# Altium footprint library Arduino.PcbLib: 12 footprints
Each footprint in its own frame and in the unit in brackets; x right, y up, seen from the top. Pads: shape width x height; smd on the part's side, far side on the other; paste and mask are expansions set on the pad; w line width, h text height; cw(c..) or ccw(c..) is an arc to the next point about the centre after c.
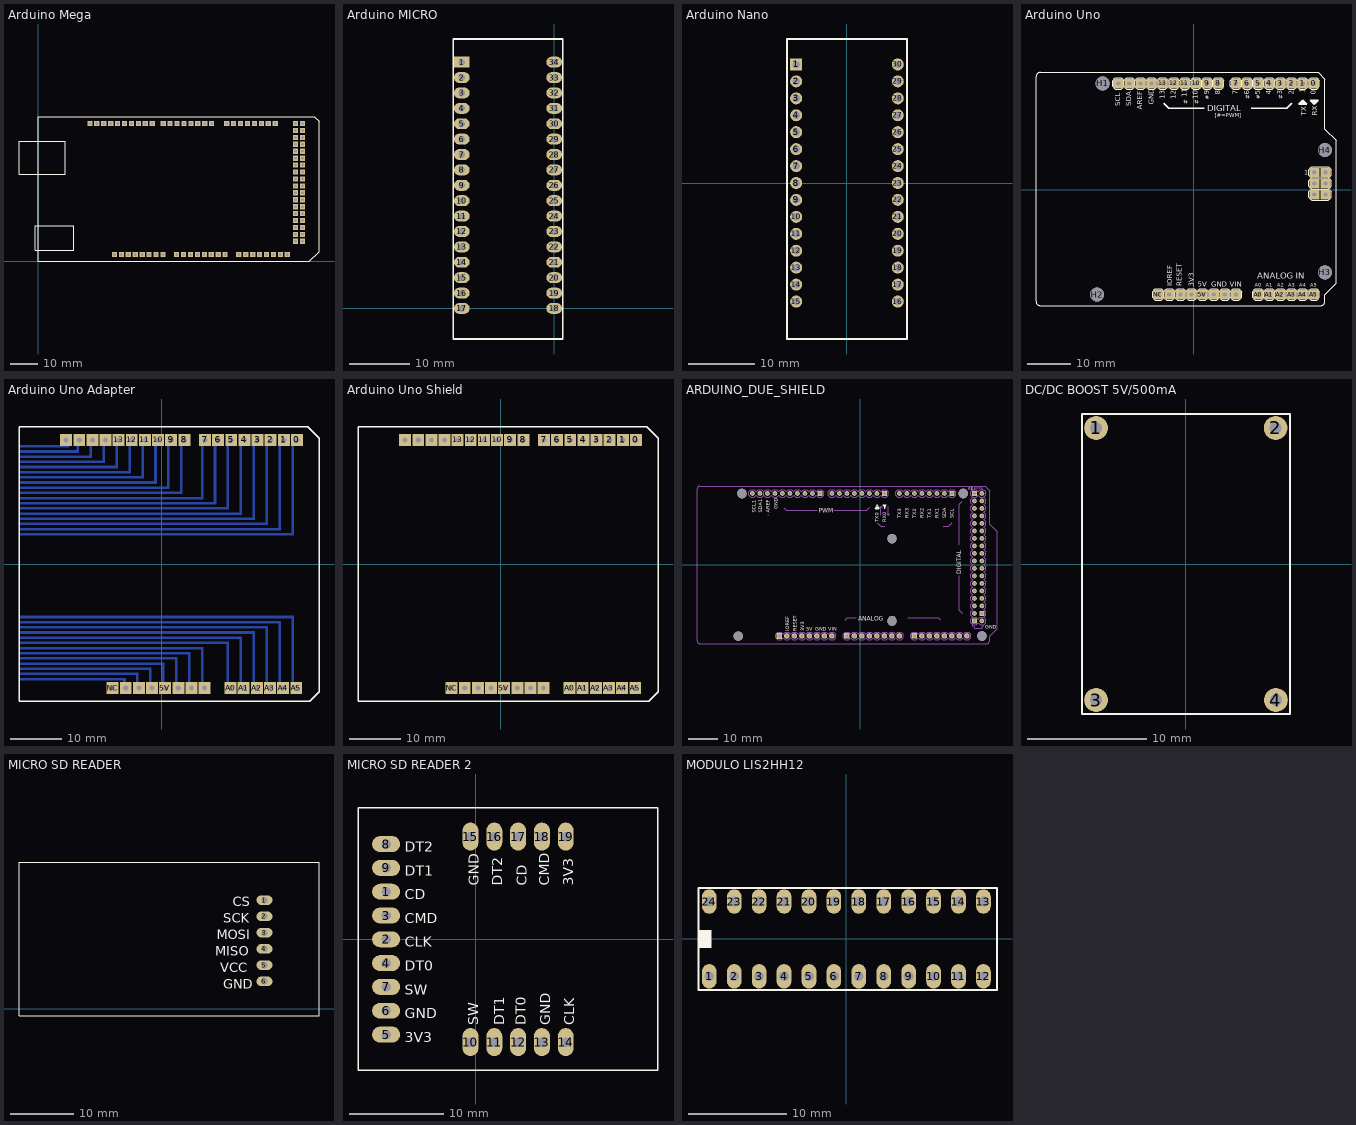
[diagram p0: the footprints below, top view; thin cyan lines are the x and y axes]

## Arduino Due [mm]

## Arduino Mega [mm]
pads (86):
  rect 1.9x1.9 hole 1: 0(63.64,50.5) 1(61.1,50.5) 2(58.56,50.5) 3(56.02,50.5) 3V3(35.62,2.5) 4(53.48,50.5) 5(50.94,50.5) 5V(38.16,2.5) 5V_2(94.4,50.5) 5V_3(96.94,50.5) 6(48.4,50.5) 7(45.86,50.5) 8(41.86,50.5) 9(39.32,50.5) 10(36.78,50.5) 11(34.24,50.5) 12(31.7,50.5) 13(29.16,50.5) 14(69.16,50.5) 15(71.7,50.5) 16(74.24,50.5) 17(76.78,50.5) 18(79.32,50.5) 19(81.86,50.5) 20(84.4,50.5) 21(86.94,50.5) 22(94.4,47.96) 23(96.94,47.96) 24(94.4,45.42) 25(96.94,45.42) 26(94.4,42.88) 27(96.94,42.88) 28(94.4,40.34) 29(96.94,40.34) 30(94.4,37.8) 31(96.94,37.8) 32(94.4,35.26) 33(96.94,35.26) 34(94.4,32.72) 35(96.94,32.72) 36(94.4,30.18) 37(96.94,30.18) 38(94.4,27.64) 39(96.94,27.64) 40(94.4,25.1) 41(96.94,25.1) 42(94.4,22.56) 43(96.94,22.56) 44(94.4,20.02) 45(96.94,20.02) 46(94.4,17.48) 47(96.94,17.48) 48(94.4,14.94) 49(96.94,14.94) 50(94.4,12.4) 51(96.94,12.4) 52(94.4,9.86) 53(96.94,9.86) A0(50.8,2.5) A1(53.34,2.5) A2(55.88,2.5) A3(58.42,2.5) A4(60.96,2.5) A5(63.5,2.5) A6(66.04,2.5) A7(68.58,2.5) A8(73.6,2.5) A9(76.14,2.5) A10(78.68,2.5) A11(81.22,2.5) A12(83.76,2.5) A13(86.3,2.5) A14(88.84,2.5) A15(91.38,2.5) AREF(24.08,50.5) GND1(40.7,2.5) GND2(43.24,2.5) GND3(26.62,50.5) GND4(94.4,7.32) GND5(96.94,7.32) IOREF(30.54,2.5) NC(28,2.5) RESET(33.08,2.5) SCL(19,50.5) SDA(21.54,50.5) Vin(45.78,2.5)
Top Overlay:
  lines w0.254: -7,32 10,32 10,44 -7,44 -7,32 ; -1,4 -1,13 13,13 13,4 -1,4 ; 0,0 0,53 101.3,53 103,51.3 103,3.5 99.5,0 0,0

## Arduino MICRO [mm]
pads (34):
  rect 2.6x1.8 hole 1.1: 1(-15.24,40.64)
  oval 2.6x1.8 hole 1.1: 2(-15.24,38.1) 3(-15.24,35.56) 4(-15.24,33.02) 5(-15.24,30.48) 6(-15.24,27.94) 7(-15.24,25.4) 8(-15.24,22.86) 9(-15.24,20.32) 10(-15.24,17.78) 11(-15.24,15.24) 12(-15.24,12.7) 13(-15.24,10.16) 14(-15.24,7.62) 15(-15.24,5.08) 16(-15.24,2.54) 17(-15.24,0) 18(0,0) 19(0,2.54) 20(0,5.08) 21(0,7.62) 22(0,10.16) 23(0,12.7) 24(0,15.24) 25(0,17.78) 26(0,20.32) 27(0,22.86) 28(0,25.4) 29(0,27.94) 30(0,30.48) 31(0,33.02) 32(0,35.56) 33(0,38.1) 34(0,40.64)
Top Overlay:
  lines w0.254: -16.62,-5.04 1.38,-5.04 1.38,44.46 -16.62,44.46 -16.62,-5.04
3D body "ARDUINO MICRO.STEP": height 12.61, standoff -5.99, extent -16.62,-4.99 1.38,44.42

## Arduino Nano [mm]
pads (30):
  rect 1.8x1.8 hole 1.1: 1(-7.62,17.78)
  round 1.8 hole 1.1: 2(-7.62,15.24) 3(-7.62,12.7) 4(-7.62,10.16) 5(-7.62,7.62) 6(-7.62,5.08) 7(-7.62,2.54) 8(-7.62,0) 9(-7.62,-2.54) 10(-7.62,-5.08) 11(-7.62,-7.62) 12(-7.62,-10.16) 13(-7.62,-12.7) 14(-7.62,-15.24) 15(-7.62,-17.78) 16(7.62,-17.78) 17(7.62,-15.24) 18(7.62,-12.7) 19(7.62,-10.16) 20(7.62,-7.62) 21(7.62,-5.08) 22(7.62,-2.54) 23(7.62,0) 24(7.62,2.54) 25(7.62,5.08) 26(7.62,7.62) 27(7.62,10.16) 28(7.62,12.7) 29(7.62,15.24) 30(7.62,17.78)
Top Overlay:
  lines w0.254: -9,-23.4 9,-23.4 9,21.6 -9,21.6 -9,-23.4
3D body "arduino nano.STEP": height 12.72, standoff -5.88, extent -9,-23.4 9,21.6

## Arduino Uno [mm]
pads (42):
  rect 2.3x2.3 hole 1: 0(27.44,24.26) 1(24.9,24.26) 2(22.36,24.26) 3(19.82,24.26) 3V3(-0.5,-24) 4(17.28,24.26) 5(14.74,24.26) 5V(2.04,-24) 6(12.2,24.26) 7(9.66,24.26) 8(5.596,24.26) 9(3.056,24.26) 10(0.516,24.26) 11(-2.024,24.26) 12(-4.564,24.26) 13(-7.104,24.26) A0(14.74,-24) A1(17.28,-24) A2(19.82,-24) A3(22.36,-24) A4(24.9,-24) A5(27.44,-24) AREF(-12.184,24.26) GND1(4.58,-24) GND2(7.12,-24) GND3(-9.644,24.26) ICSP1(27.567,3.94) ICSP2(30.107,3.94) ICSP3(27.567,1.4) ICSP4(30.107,1.4) ICSP5(27.567,-1.14) ICSP6(30.107,-1.14) IOREF(-5.58,-24) NC(-8.12,-24) RESET(-3.04,-24) SCL(-17.264,24.26) SDA(-14.724,24.26) Vin(9.66,-24)
  round 3.2 hole 3.2: H1(-20.82,24.26) H2(-22.09,-24) H3(29.98,-18.92) H4(29.98,9.02)
Bottom Layer:
  lines w0.305: -14.724,24.26 -14.47,24.26
Top Overlay:
  drawing of 281 lines, arcs and shapes, not listed
  text "5V" at 0.897,-22.222 h1.21
  text "A0" at 13.953,-22.197 h0.86
  text "ANALOG IN" at 14.486,-20.444 h1.42
  text "AREF" at -11.814,18.203 h1.21
  text "1" at 25.205,3.407 h1.08
  text "GND" at -9.172,19.386 h1.21
  text "RESET" at -2.786,-22.095 h1.21
  text "3V3" at 0.008,-22.222 h1.21
  text "A1" at 16.493,-22.197 h0.86
  text "A2" at 19.033,-22.197 h0.86
  text "A3" at 21.573,-22.197 h0.86
  text "A4" at 24.113,-22.197 h0.86
  text "A5" at 26.653,-22.197 h0.86
  text "VIN" at 8.263,-22.222 h1.21
  text "GND" at 3.97,-22.222 h1.21
  text "IOREF" at -4.945,-22.095 h1.21
  text "DIGITAL" at 3.107,17.885 h1.42
  text "TX" at 25.662,16.919 h1.21
  text "RX" at 28.202,16.894 h1.21
  text "13" at -6.657,20.669 h1.21
  text "12" at -4.117,20.669 h1.21
  text "11" at -1.577,21.072 h1.21
  text "10" at 0.963,20.669 h1.21
  text "9" at 3.503,21.676 h1.21
  text "8" at 6.043,21.676 h1.21
  text "7" at 10.107,21.676 h1.21
  text "6" at 12.647,21.676 h1.21
  text "5" at 15.187,21.676 h1.21
  text "4" at 17.727,21.676 h1.21
  text "3" at 20.267,21.676 h1.21
  text "2" at 22.807,21.676 h1.21
  text "1" at 25.347,22.079 h1.21
  text "0" at 27.887,21.676 h1.21
  text "[#=PWM]" at 4.834,16.513 h0.95
  text "#" at -1.4,19.5 h0.95
  text "#" at 1.1,19.5 h0.95
  text "#" at 15.2,20.6 h0.95
  text "#" at 20.3,20.6 h0.95
  text "#" at 12.8,20.6 h0.95
  text "#" at 3.6,20.5 h0.95
  text "SCL" at -16.8,19.1 h1.21
  text "SDA" at -14.271,19.087 h1.21

## Arduino Uno Adapter [mm]
pads (32):
  rect 2.3x2.3 hole 1: 0(26.1,24) 1(23.56,24) 2(21.02,24) 3(18.48,24) 3V3(-1.92,-24) 4(15.94,24) 5(13.4,24) 5V(0.62,-24) 6(10.86,24) 7(8.32,24) 8(4.32,24) 9(1.78,24) 10(-0.76,24) 11(-3.3,24) 12(-5.84,24) 13(-8.38,24) A0(13.26,-24) A1(15.8,-24) A2(18.34,-24) A3(20.88,-24) A4(23.42,-24) A5(25.96,-24) AREF(-13.46,24) GND1(3.16,-24) GND2(5.7,-24) GND3(-10.92,24) IOREF(-7,-24) NC(-9.54,-24) RESET(-4.46,-24) SCL(-18.54,24) SDA(-16,24) Vin(8.24,-24)
Bottom Layer:
  rectangle: 10,11.5 10.5,24
  rectangle: 12.5,10.5 13,24
  rectangle: 15,9.5 15.5,24
  rectangle: 17.5,8.5 18,24
  rectangle: 20,7.5 20.5,24
  rectangle: 22.5,6.5 23,24
  rectangle: 25,5.5 25.5,24
  rectangle: 25,-24 25.5,-10
  rectangle: 22.5,-24 23,-11
  rectangle: 20,-24 20.5,-12
  rectangle: -7.5,-23.5 -7,-22
  rectangle: -27.5,-22.5 -7,-22
  rectangle: -27.5,-21.5 -4.5,-21
  rectangle: -27.5,-20.5 -2,-20
  rectangle: -27.5,-19.5 0.5,-19
  rectangle: -27.5,-18.5 3,-18
  rectangle: -27.5,-17.5 5.5,-17
  rectangle: -27.5,-16.5 8,-16
  rectangle: -27.5,-15.5 13,-15
  rectangle: -27.5,-14.5 15.5,-14
  rectangle: -27.5,-13.5 18,-13
  rectangle: -27.5,-12.5 20.5,-12
  rectangle: -27.5,-11.5 23,-11
  rectangle: -27.5,-10.5 25.5,-10
  rectangle: -5,-23.5 -4.5,-21
  rectangle: -2.5,-23.5 -2,-20
  rectangle: 0,-23.5 0.5,-19
  rectangle: 2.5,-23.5 3,-18
  rectangle: 5,-23.5 5.5,-17
  rectangle: 7.5,-23.5 8,-16
  rectangle: 12.5,-23.5 13,-15
  rectangle: 15,-23.5 15.5,-14
  rectangle: 17.5,-23.5 18,-13
  rectangle: 7.5,12.5 8,24
  rectangle: 3.5,13.5 4,24
  rectangle: 1,14.5 1.5,24
  rectangle: -1.5,15.5 -1,24
  rectangle: -4,16.5 -3.5,24
  rectangle: -6.5,17.5 -6,24
  rectangle: -9,18.5 -8.5,24
  rectangle: -11.5,19.5 -11,24
  rectangle: -14,20.5 -13.5,24
  rectangle: -27.5,9.5 15.5,10
  rectangle: -27.5,8.5 18,9
  rectangle: -27.5,7.5 20.5,8
  rectangle: -27.5,6.5 23,7
  rectangle: -27.5,5.5 25.5,6
  rectangle: -27.5,10.5 13,11
  rectangle: -27.5,11.5 10.5,12
  rectangle: -27.5,12.5 8,13
  rectangle: -27.5,13.5 4,14
  rectangle: -27.5,14.5 1.5,15
  rectangle: -27.5,15.5 -1,16
  rectangle: -27.5,16.5 -3.5,17
  rectangle: -27.5,17.5 -6,18
  rectangle: -27.5,18.5 -8.5,19
  rectangle: -27.5,19.5 -11,20
  rectangle: -27.5,20.5 -13.5,21
  rectangle: -27.5,22.5 -17.9,23
  rectangle: -27.5,21.5 -16,22
  rectangle: -16.5,21.5 -16,24
Top Overlay:
  lines w0.254: -27.64,-26.5 28.56,-26.5 30.36,-24.7 30.36,-6.9 30.36,24.3 28.16,26.5 -27.64,26.5 -27.64,-26.5

## Arduino Uno Shield [mm]
pads (32):
  rect 2.3x2.3 hole 1: 0(26.1,24) 1(23.56,24) 2(21.02,24) 3(18.48,24) 3V3(-1.92,-24) 4(15.94,24) 5(13.4,24) 5V(0.62,-24) 6(10.86,24) 7(8.32,24) 8(4.32,24) 9(1.78,24) 10(-0.76,24) 11(-3.3,24) 12(-5.84,24) 13(-8.38,24) A0(13.26,-24) A1(15.8,-24) A2(18.34,-24) A3(20.88,-24) A4(23.42,-24) A5(25.96,-24) AREF(-13.46,24) GND1(3.16,-24) GND2(5.7,-24) GND3(-10.92,24) IOREF(-7,-24) NC(-9.54,-24) RESET(-4.46,-24) SCL(-18.54,24) SDA(-16,24) Vin(8.24,-24)
Top Overlay:
  lines w0.254: -27.64,-26.5 28.56,-26.5 30.36,-24.7 30.36,-6.9 30.36,24.3 28.16,26.5 -27.64,26.5 -27.64,-26.5

## ARDUINO_DUE_SHIELD [mil]
pads (95):
  rect 63x63 / inner round 58.2 / far side rect 63x63 hole 42: 0(324,951) 5V0_1(1524,951) 8(-536,951) 21(1224,951) 53(1624,-649) GND_2(1524,-749)
  round 63 hole 42: 1(224,951) 2(124,951) 3(24,951) 4(-76,951) 5(-176,951) 5V0_2(1624,951) 6(-276,951) 7(-376,951) 9(-636,951) 10(-736,951) 11(-836,951) 12(-936,951) 13(-1036,951) 14(524,951) 15(624,951) 16(724,951) 17(824,951) 18(924,951) 19(1024,951) 20(1124,951) 22(1524,851) 23(1624,851) 24(1524,751) 25(1624,751) 26(1524,651) 27(1624,651) 28(1524,551) 29(1624,551) 30(1524,451) 31(1624,451) 32(1524,351) 33(1624,351) 34(1524,251) 35(1624,251) 36(1524,151) 37(1624,151) 38(1524,51) 39(1624,51) 40(1524,-49) 41(1624,-49) 42(1524,-149) 43(1624,-149) 44(1524,-249) 45(1624,-249) 46(1524,-349) 47(1624,-349) 48(1524,-449) 49(1624,-449) 50(1524,-549) 51(1624,-549) 52(1524,-649) AREF(-1236,951) GND_3(1624,-749) GND_4(-1136,951) SCL1(-1436,951) SDA1(-1336,951)
  round 74 hole 40: 3V3(-776,-949) 5V0(-676,-949) A1(-76,-949) A2(24,-949) A3(124,-949) A4(224,-949) A5(324,-949) A6(424,-949) A7(524,-949) A9(824,-949) A10(924,-949) A11(1024,-949) CANRX(1324,-949) CANTX(1424,-949) DAC0(1124,-949) DAC1(1224,-949) GND(-576,-949) GND_1(-476,-949) IOREF(-976.28,-949.51) RESET(-876,-949.04) VIN(-376,-949)
  rect 74x74 / inner round 68.37 / far side rect 74x74 hole 40: A0(-176,-949) A8(724,-949) NC_2(-1076.28,-949.51)
  round 126 hole 126 unplated: MH1(-1576,951) MH2(1374,951) MH3(1624,-949)
  round 125.98 hole 125.98 unplated: MH4(1625,-951) MH5(-1575,949) MH6(1375,949) MH7(-1625,-951) MH8(425,349) MH9(425,-751)
Top Overlay:
  lines w16: 200,749 225,774 ; 200,749 225,749 ; 200,749 225,799 250,749 ; 225,749 250,749 ; 225,749 225,774 ; 225,774 250,749 ; 300,799 325,774 ; 300,799 325,749 350,799 ; 300,799 325,799 ; 325,774 325,799 ; 325,774 350,799 ; 325,799 350,799
  text "AREF" at -1202.52,693.76 h47.6
  text "IOREF" at -946.17,-883.52 h47.6
  text "SCL1" at -1394.52,693.76 h47.6
  text "SDA1" at -1302.52,693.76 h47.6
  text "DIGITAL" at 1350,-126 h56.1
  text "GND" at 1665,-851 h47.6
  text "5V" at 1505,1034 h37.4
  text "PWM" at -550,691 h56.1
  text "TX1" at 950,619 h47.6
  text "RX1" at 1050,619 h47.6
  text "TX3" at 550,619 h47.6
  text "RX3" at 650,619 h47.6
  text "RX2" at 850,619 h47.6
  text "TX2" at 750,619 h47.6
  text "SCL" at 1250,619 h47.6
  text "SDA" at 1150,619 h47.6
  text "GND" at -595.52,-882.83 h47.6
  text "VIN" at -423.52,-882.83 h47.6
  text "5V" at -715.52,-882.83 h47.6
  text "3V3" at -746.17,-883.52 h47.6
  text "RESET" at -846.17,-883.52 h47.6
  text "RX0" at 350,569 h47.6
  text "TX0" at 250,569 h47.6
  text "GND" at -1095.75,739.48 h47.6
  text "ANALOG   IN" at -24,-747 h56.1
Mechanical 7:
  drawing of 482 lines, arcs and shapes, not listed
  text "52" at 1375,-676 h47.6
  text "53" at 1700,-676 h47.6
  text "48" at 1375,-476 h47.6
  text "50" at 1375,-576 h47.6
  text "46" at 1375,-376 h47.6
  text "44" at 1375,-276 h47.6
  text "51" at 1700,-576 h47.6
  text "49" at 1700,-476 h47.6
  text "47" at 1700,-376 h47.6
  text "45" at 1701.5,-272 h47.6
  text "42" at 1375,-176 h47.6
  text "43" at 1700.5,-170.5 h47.6
  text "40" at 1375,-76 h47.6
  text "41" at 1700,-76 h47.6
  text "39" at 1700,24 h47.6
  text "38" at 1375,24 h47.6
  text "37" at 1700,124 h47.6
  text "36" at 1375,124 h47.6
  text "35" at 1700,224 h47.6
  text "34" at 1375,224 h47.6
  text "33" at 1700,324 h47.6
  text "32" at 1375,324 h47.6
  text "31" at 1700,424 h47.6
  text "30" at 1375,424 h47.6
  text "28" at 1375,524 h47.6
  text "26" at 1375,624 h47.6
  text "24" at 1375,724 h47.6
  text "22" at 1375,824 h47.6
  text "21" at 1250,789 h47.6
  text "20" at 1150,789 h47.6
  text "19" at 1050,789 h47.6
  text "18" at 950,789 h47.6
  text "17" at 850,789 h47.6
  text "16" at 750,789 h47.6
  text "15" at 650,789 h47.6
  text "14" at 550,789 h47.6
  text "CANTX" at 1438,-890 h34
  text "CANRX" at 1343,-890 h34
  text "DAC1" at 1243,-890 h34
  text "DAC0" at 1143,-890 h34
  text "A11" at 1047,-866 h47.6
  text "A10" at 955,-866 h47.6
  text "A9" at 855,-866 h47.6
  text "A8" at 755,-866 h47.6
  text "A7" at 555,-866 h47.6
  text "6" at 450,-866 h47.6
  text "A5" at 350,-866 h47.6
  text "A4" at 255,-866 h47.6
  text "A3" at 155,-866 h47.6
  text "A2" at 55,-866 h47.6
  text "A1" at -55,-866 h47.6
  text "A0" at -145,-866 h47.6
  text "13" at -1000,774 h47.6
  text "12" at -900,774 h47.6
  text "11" at -800,774 h47.6
  text "10" at -700,774 h47.6
  text "9" at -600,824 h47.6
  text "8" at -500,824 h47.6
  text "7" at -350,824 h47.6
  text "6" at -250,824 h47.6
  text "5" at -150,824 h47.6
  text "4" at -50,824 h47.6
  text "3" at 50,824 h47.6
  text "2" at 150,824 h47.6
  text "1" at 250,824 h47.6
  text "0" at 350,824 h47.6
  text "COMMUNICATION" at 349,476 h56.1
Mechanical 8:
  lines w10: 1665,1049 1725,989 1725,539

## DC/DC BOOST 5V/500mA [mm]
pads (4):
  round 2 hole 1 unplated: 1(-7.562,11.438) 2(7.538,11.438) 3(-7.562,-11.438) 4(7.563,-11.438)
Top Overlay:
  lines w0.15: -8.737,-12.612 -8.737,12.612 8.738,12.612 8.738,-12.612 -8.737,-12.612

## MICRO SD READER [mm]
pads (6):
  oval 2.5x1.5 hole 1: 1(50,16.975) 2(50,14.435) 3(50,11.895) 4(50,9.355) 5(50,6.815) 6(50,4.275)
Top Overlay:
  lines w0.15: 11.625,-1.1 58.525,-1.1 58.525,22.9 11.625,22.9 11.625,-1.1
  text "CS" at 45.049,16.05 h1.5
  text "SCK" at 43.55,13.465 h1.5
  text "MOSI" at 42.55,10.88 h1.5
  text "MISO" at 42.3,8.295 h1.5
  text "VCC" at 43.075,5.71 h1.5
  text "GND" at 43.55,3.125 h1.5
3D body "MicroSD Reader Assembly.stp": height 6.71, standoff 0.01, extent 11.652,-1.118 58.552,22.882

## MICRO SD READER 2 [mm]
pads (19):
  oval 3x1.7 hole 1: 1(-9.58,5.08) 2(-9.58,0) 3(-9.58,2.54) 4(-9.58,-2.54) 5(-9.58,-10.16) 6(-9.58,-7.62) 7(-9.58,-5.08) 8(-9.58,10.16) 9(-9.58,7.62)
  oval 1.7x3 hole 1: 10(-0.58,-10.96) 11(1.96,-10.96) 12(4.5,-10.96) 13(7.04,-10.96) 14(9.58,-10.96) 15(-0.58,10.96) 16(1.96,10.96) 17(4.5,10.96) 18(7.04,10.96) 19(9.58,10.96)
Top Overlay:
  lines w0.15: -12.58,-13.94 19.42,-13.94 19.42,14.01 -12.58,14.01 -12.58,-13.94
  text "DT2" at -7.58,9.335 h1.1
  text "DT1" at -7.58,6.798 h1.1
  text "CD" at -7.58,4.261 h1.1
  text "CMD" at -7.58,1.724 h1.1
  text "CLK" at -7.58,-0.813 h1.1
  text "DT0" at -7.58,-3.349 h1.1
  text "SW" at -7.58,-5.886 h1.1
  text "GND" at -7.58,-8.423 h1.1
  text "3V3" at -7.58,-10.96 h1.1
  text "GND" at 0.278,5.71 h1.1
  text "DT2" at 2.82,5.71 h1.1
  text "CD" at 5.399,5.71 h1.1
  text "CMD" at 7.806,5.71 h1.1
  text "3V3" at 10.375,5.71 h1.1
  text "SW" at 0.266,-9.145 h1.1
  text "DT1" at 3.007,-9.145 h1.1
  text "DT0" at 5.304,-9.145 h1.1
  text "GND" at 7.903,-9.145 h1.1
  text "CLK" at 10.493,-9.145 h1.1

## MODULO LIS2HH12 [mm] "ADAPTER BOARD LIS2HH12 DIL24"
pads (24):
  oval 1.5x2.5 hole 1: 1(-13.97,-3.81) 2(-11.43,-3.81) 3(-8.89,-3.81) 4(-6.35,-3.81) 5(-3.81,-3.81) 6(-1.27,-3.81) 7(1.27,-3.81) 8(3.81,-3.81) 9(6.35,-3.81) 10(8.89,-3.81) 11(11.43,-3.81) 12(13.97,-3.81) 13(13.97,3.81) 14(11.43,3.81) 15(8.89,3.81) 16(6.35,3.81) 17(3.81,3.81) 18(1.27,3.81) 19(-1.27,3.81) 20(-3.81,3.81) 21(-6.35,3.81) 22(-8.89,3.81) 23(-11.43,3.81) 24(-13.97,3.81)
Top Overlay:
  rectangle: -15.07,-0.947 -13.72,0.928
  lines w0.2: -15.07,-5.185 -15.07,5.165 15.355,5.165 15.355,-5.185 -15.07,-5.185
3D body "21640.stp": height 3.8, standoff -3.57, extent -15.05,-5.03 15.35,5.07